# Altium footprint library PCBLIB.PcbLib: 557 footprints (part 24 of 36)
Each footprint in its own frame and in the unit in brackets; x right, y up, seen from the top. Pads: shape width x height; smd on the part's side, far side on the other; paste and mask are expansions set on the pad; w line width, h text height; cw(c..) or ccw(c..) is an arc to the next point about the centre after c.
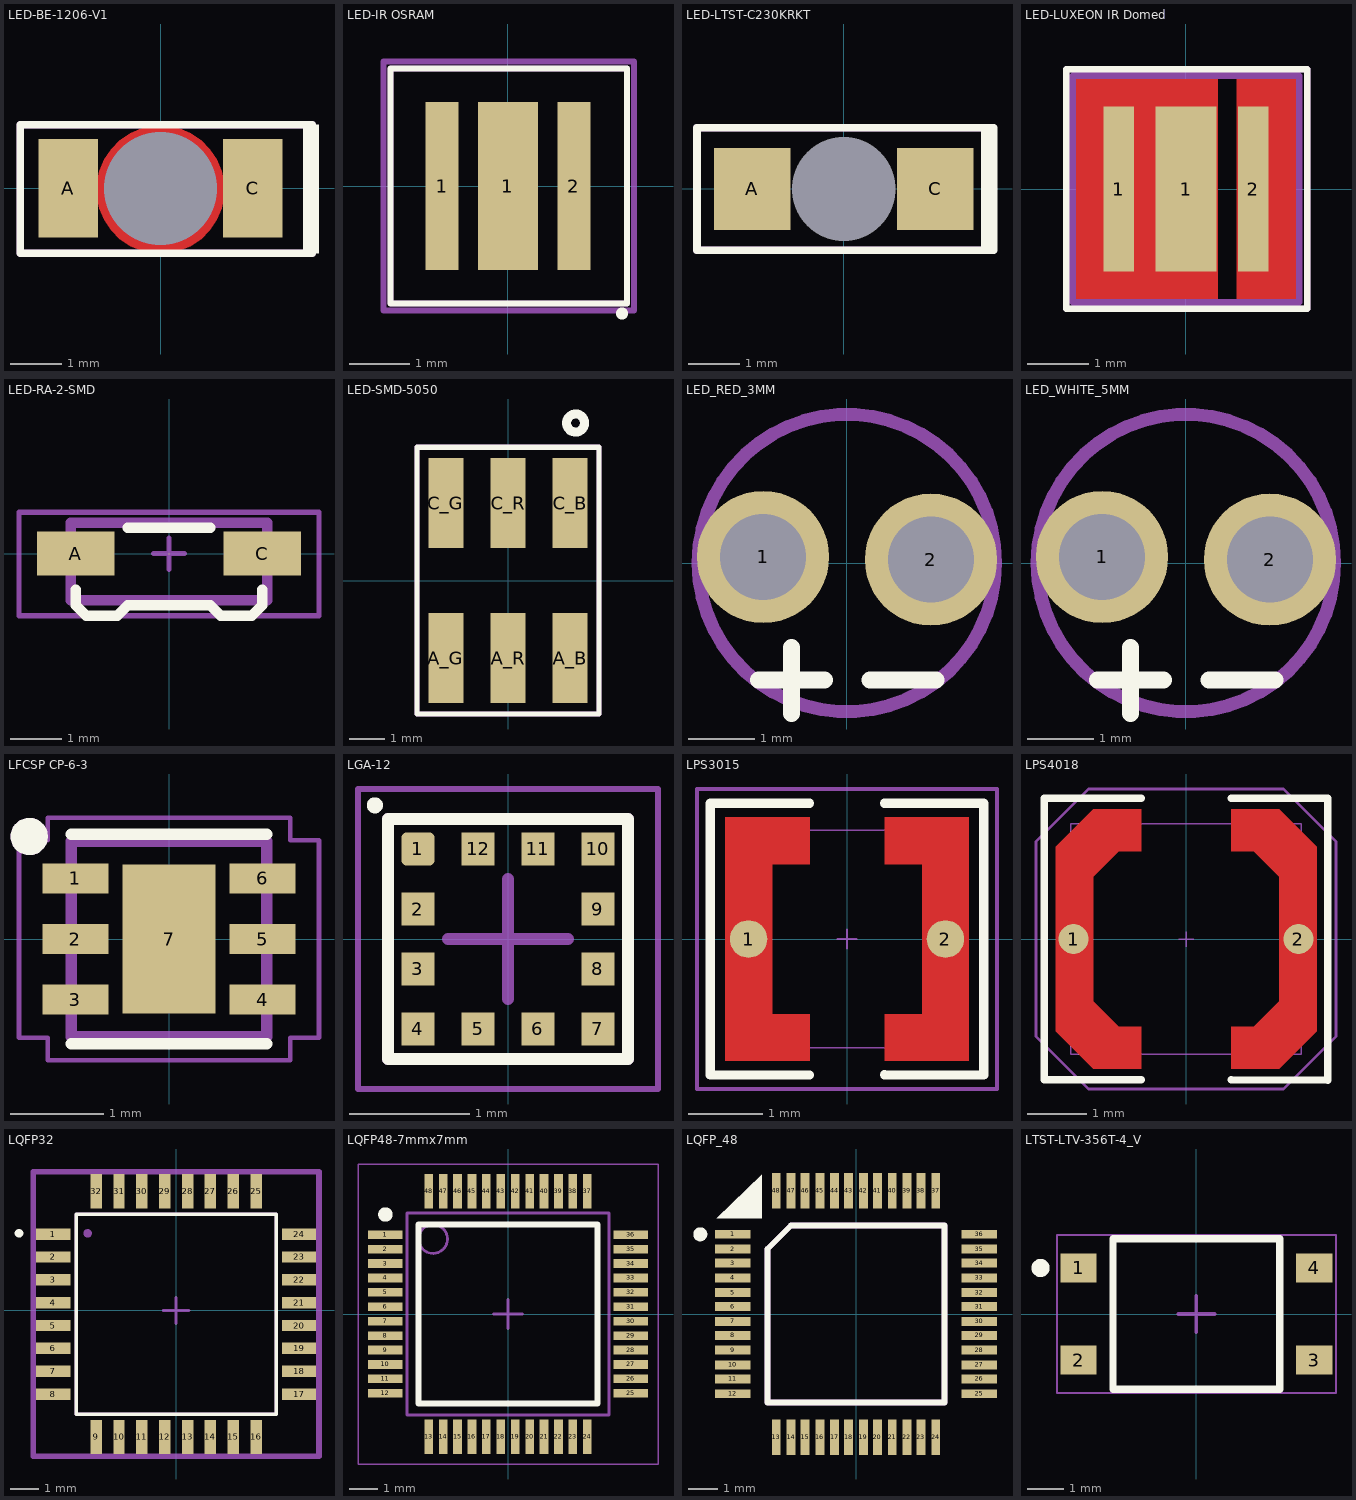
[diagram p23: the footprints below, top view; thin cyan lines are the x and y axes]

## LED-BE-1206-V1 [mil]
pads (3):
  round 1 hole 87 unplated: 1(0,0)
  rect 46x76 smd mask+1.97: A(-71,0) C(71,0)
Top Layer:
  pour cut-out: -49.04,-1 -49.04,-5.83 -47.16,-15.3 -43.46,-24.23 -38.09,-32.26 -31.26,-39.09 -23.23,-44.46 -14.3,-48.16 -4.83,-50.04 0,-50.04 4.83,-50.04 14.3,-48.16 23.23,-44.46 31.26,-39.09 38.09,-32.26 43.46,-24.23 47.16,-15.3 49.04,-5.83 49.04,-1 49.04,3.83 47.16,13.3 43.46,22.23 38.09,30.26 31.26,37.09 23.23,42.46 14.3,46.16 4.83,48.04 0,48.04 -4.83,48.04 -14.3,46.16 -23.23,42.46 -31.26,37.09 -38.09,30.26 -43.46,22.23 -47.16,13.3 -49.04,3.83
Top Overlay:
  region: 122.05,49 110,49 110,-50 122.05,-50
  lines w6: 116.83,-50 -108,-50 -108,49 116.83,49
ASM Top:
  lines w5.91: 116.83,-50 116.83,49
  lines w6: 116.83,-50 -108,-50 -108,49 116.83,49
3D body "bottom entry.STEP": height 10.38, standoff -31, extent -61,-33 64.98,30

## LED-IR OSRAM [mm] "LUXEON IR Domed (90 degree dome in 3D)"
height 0.7
pads (3):
  rect 0.55x2.8 smd paste-1 mask+0: 1(-1.1,0)
  rect 1x2.8 smd paste-5 mask+0: 1(0,0)
  rect 0.55x2.8 smd paste-2 mask+0: 2(1.1,0)
Top Overlay:
  circle w0.1: c1.9,-2.125 r0.05
  lines w0.1: -1.956,-1.956 1.981,-1.956 1.981,1.956 -1.956,1.956 -1.956,-1.956
Top Paste:
  rectangle: 0.875,-1.25 1.325,1.25
  rectangle: -0.45,0.15 0.45,1.3
  rectangle: -1.325,-1.25 -0.925,1.35
  region: 0.45,-0.15 -0.45,-0.15 -0.45,-1.3 0.45,-1.3
Mechanical 15:
  lines w0.1: -0.329,0 0.306,0 ; 0,-0.305 0,0.33 ; -2.075,-2.075 -2.075,2.075 2.1,2.075 2.1,-2.075 -2.075,-2.075
ASM Top:
  lines w0.1: -1.956,-1.956 1.981,-1.956 1.981,1.956 -1.956,1.956 -1.956,-1.956
  text ".designator" at -0.66,-0.152 h0.8
3D body "SFH_4717AS_A01_20180620_geometry.STEP": height 2.67, standoff 0.01, extent -1.925,-1.925 1.925,1.925

## LED-LTST-C230KRKT [mil]
pads (3):
  rect 1x1 hole 80 unplated: 96(0,0)
  rect 59x63 smd mask+1.97: A(-70.5,0) C(70.5,0)
Top Overlay:
  region: 118.11,47.24 105.86,47.24 105.86,-47.24 118.11,-47.24
  lines w6: 115.4,-47.24 -113,-47.24 -113,47.24 115.4,47.24
ASM Top:
  lines w5.91: 110.57,-47.24 110.57,47.24
  lines w6: 110.57,-47.24 -113,-47.24 -113,47.24 110.57,47.24
  text ".designator" at -95,-27 h31.5
3D body "LTST-C230KRKT.STEP": height 12.31, standoff -31.39, extent -64.35,-32 64,31

## LED-LUXEON IR Domed [mm] "LUXEON IR Domed (90 degree dome in 3D)"
height 0.7
pads (3):
  rect 0.5x2.7 smd paste-1 mask+0: 1(-1.1,0)
  rect 1x2.7 smd paste-5 mask+0: 1(0,0)
  rect 0.5x2.7 smd paste-2 mask+0: 2(1.1,0)
Top Layer:
  rectangle: 0.825,-1.8 1.8,1.8
  rectangle: -0.41,-1.4 0.41,-1.29
  region: 0.41,1.4 -0.41,1.4 -0.41,1.29 0.41,1.29
  rectangle: -1.8,-1.8 0.525,1.8
Top Overlay:
  lines w0.1: -1.956,-1.956 -1.956,1.956 1.981,1.956 1.981,-1.956 -1.956,-1.956
Top Paste:
  rectangle: -1.325,-1.25 -0.875,1.25
  rectangle: -0.45,-1.25 0.45,1.25
  rectangle: 0.875,-1.25 1.325,1.25
Mechanical 15:
  lines w0.1: -0.329,0 0.306,0 ; 0,-0.305 0,0.33 ; -1.85,-1.85 1.85,-1.85 1.85,1.85 -1.85,1.85 -1.85,-1.85
ASM Top:
  lines w0.1: -1.956,-1.956 -1.956,1.956 1.981,1.956 1.981,-1.956 -1.956,-1.956
  text ".designator" at -0.66,-0.152 h0.8
3D body "LUXEON IR Domed Line 90 Deg 00000463 20161011.STEP": height 2.77, standoff 0, extent -1.85,-1.85 1.85,1.85

## LED-RA-2-SMD [mm]
pads (2):
  rect 1.5x0.85 smd: A(-1.8,0) C(1.8,0)
Top Overlay:
  lines w0.2: -1.8,-0.7 -1.8,-0.997 -1.597,-1.2 -1,-1.2 -0.8,-1 0,-1 0.8,-1 1,-1.2 1.6,-1.2 1.8,-1 1.8,-0.7 ; -0.8,0.5 0.8,0.5
Mechanical 15:
  lines w0.1: -0.3,0 0.3,0 ; 0,-0.3 0,0 0,0.3 ; -2.9,-1.2 2.9,-1.2 2.9,0.8 -2.9,0.8 -2.9,-1.2
ASM Top:
  lines w0.2: -1.9,-0.9 1.9,-0.9 1.9,0.6 -1.9,0.6 -1.9,-0.9
  text ".designator" at -0.5,-0.5 h0.8
3D body "CUW_Y3SH_121213_geometry.STEP": height 0.61, standoff 0.01, extent -1.9,-1 1.9,0

## LED-SMD-5050 [mil]
pads (6):
  rect 39x100 smd: A_B(69,-86) A_G(-69,-86) A_R(0,-86) C_B(69,86) C_G(-69,86) C_R(0,86)
Top Overlay:
  circle w10: c75,175 r10
  lines w6: -101,-148 101,-148 101,148 -101,148 -101,-148
ASM Top:
  lines w6: -101,-148 101,-148 101,148 -101,148 -101,-148
  text ".designator" at -65,-13 h31.5
3D body "smd_led_5050.STEP": height 62.99, standoff 0, extent -98.85,-104.66 98,104

## LED_RED_3MM [mm]
height 8.8
pads (2):
  round 2 hole 1.3: 1(-1.269,0.091) 2(1.271,0.051)
Top Overlay:
  lines w0.254: -1.34,-1.77 -0.34,-1.77 ; -0.84,-2.28 -0.84,-1.28 ; 0.35,-1.77 1.35,-1.77
ASM Top:
  circle w0.2: c0,0 r2.25
  text ".designator" at -0.7,-0.2 h0.8
3D body: height 0.25, standoff 0, extent 0,0 0,0
3D body "STEP-WL-TMRC-3mm-wos-rev1.stp": height 5.31, standoff -26.39, extent -1.9,-1.85 1.67,2

## LED_WHITE_5MM [mm]
height 8.8
pads (2):
  round 2 hole 1.3: 1(-1.269,0.091) 2(1.271,0.051)
Top Overlay:
  lines w0.254: -1.34,-1.77 -0.34,-1.77 ; -0.84,-2.28 -0.84,-1.28 ; 0.35,-1.77 1.35,-1.77
ASM Top:
  circle w0.2: c0,0 r2.25
  text ".designator" at -0.7,-0.2 h0.8
3D body "User Library-5MM-LED-CLEAR.STEP": height 8.61, standoff -7.36, extent -2.615,-2.82 2.835,3.08
3D body: height 0.25, standoff 0, extent 0,0 0,0

## LFCSP CP-6-3 [mm] "6-Lead Lead Frame Chip Scale Package [LFCSP]  2.00 mm × 2.00 mm Body and 0.55 mm Package Height"
height 0.6
pads (7):
  rect 0.71x0.32 smd: 1(-1.005,0.65) 2(-1.005,0) 3(-1.005,-0.65) 4(1.005,-0.65) 5(1.005,0) 6(1.005,0.65)
  rect 1x1.6 smd paste-2: 7(0,0)
Top Overlay:
  circle w0.2: c-1.5,1.1 r0.1
  lines w0.127: -1.05,-1.124 1.05,-1.124 ; -1.05,1.124 1.05,1.124
Top Paste:
  region: 0.32,-0.68 -0.32,-0.68 -0.32,-0.06 0.32,-0.06
  region: 0.32,0.06 -0.32,0.06 -0.32,0.68 0.32,0.68
Mechanical 15:
  lines w0.05: -1.61,-1.06 -1.3,-1.06 -1.3,-1.3 1.3,-1.3 1.3,-1.06 1.61,-1.06 1.61,1.06 1.3,1.06 1.3,1.3 -1.3,1.3 -1.3,1.06 -1.61,1.06 -1.61,-1.06
ASM Top:
  circle w0.2: c-1.5,1.1 r0.1
  lines w0.127: -1.05,-1.05 -1.05,1.05 1.05,1.05 1.05,-1.05 -1.05,-1.05
  text ".designator" at -0.8,-0.4 h0.8
3D body "LFCSP CP-6-3.step": height 0.6, standoff 0, extent -1.2,-1 1.3,1.1

## LGA-12 [mm] "LGA, 12-Leads, Body 2.00x2.00mmx1.00mm, Pitch 0.50mm"
height 1
pads (12):
  rrect30% 0.275x0.275 smd paste-0.01 mask+0.01: 1(-0.75,0.75)
  rect 0.275x0.275 smd paste-0.01 mask+0.01: 2(-0.75,0.25) 3(-0.75,-0.25) 4(-0.75,-0.75) 5(-0.25,-0.75) 6(0.25,-0.75) 7(0.75,-0.75) 8(0.75,-0.25) 9(0.75,0.25) 10(0.75,0.75) 11(0.25,0.75) 12(-0.25,0.75)
Top Overlay:
  circle w0.1: c-1.109,1.114 r0.017
  lines w0.1: -1,-1 1,-1 1,1 -1,1 -1,-1
Mechanical 15:
  lines w0.05: -1.25,-1.25 1.25,-1.25 1.25,1.25 -1.25,1.25 -1.25,-1.25
  lines w0.1: -0.5,0 0.5,0 ; 0,-0.5 0,0.5
ASM Top:
  lines w0.1: -1,-1 -1,1 1,1 1,-1 -1,-1
  text ".designator" at -0.8,-0.2 h0.8
3D body "User Library-lga-2x2x0_9.step": height 0.95, standoff 0, extent -1,-1 1,1

## LPS3015 [mil] "Coilcraft Shielded SMT Power Inductors"
height 55
pads (2):
  round 20 smd mask+0: 1(-52.5,0) 2(52.5,0)
Top Layer:
  region: 65,-65 20,-65 20,-40 40,-40 40,40 20,40 20,65 65,65
  region: -65,65 -20,65 -20,40 -40,40 -40,-40 -20,-40 -20,-65 -65,-65
Top Overlay:
  lines w5: -20,-72.5 -73,-72.5 -73,72.5 -20,72.5 ; 20,-72.5 73,-72.5 73,72.5 20,72.5
Top Paste:
  region: -65,65 -20,65 -20,40 -40,40 -40,-40 -20,-40 -20,-65 -65,-65
  region: 65,-65 20,-65 20,-40 40,-40 40,40 20,40 20,65 65,65
Mechanical 14:
  lines w1: -58,-58 58,-58 58,58 -58,58 -58,-58
Mechanical 15:
  lines w1: -5,0 5,0 ; 0,-5 0,5
  lines w2: -80,-80 80,-80 80,80 -80,80 -80,-80
3D body "LPS3015.STEP": height 59.06, standoff 0, extent -62.13,-62.13 62.13,62.13

## LPS4018 [mil] "Coilcraft Shielded SMT Power Inductors"
height 66.9
pads (2):
  round 20 smd mask+0: 1(-75,0) 2(75,0)
Top Layer:
  region: 30.03,86.61 62.03,86.61 87.03,61.61 87.03,-61.39 62.03,-86.39 30.03,-86.39 30.03,-58.39 45.03,-58.39 62.03,-41.39 62.03,41.61 45.03,58.61 30.03,58.61
  region: -29.97,-86.39 -61.97,-86.39 -86.97,-61.39 -86.97,61.61 -61.97,86.61 -29.97,86.61 -29.97,58.61 -44.97,58.61 -61.97,41.61 -61.97,-41.39 -44.97,-58.39 -29.97,-58.39
Top Overlay:
  lines w5: -30,-94 -94.5,-94 -94.5,94 -30,94 ; 30.03,-94 94.5,-94 94.5,94 30.03,94
Top Paste:
  region: 30.03,86.61 62.03,86.61 87.03,61.61 87.03,-61.39 62.03,-86.39 30.03,-86.39 30.03,-58.39 45.03,-58.39 62.03,-41.39 62.03,41.61 45.03,58.61 30.03,58.61
  region: -29.97,-86.39 -61.97,-86.39 -86.97,-61.39 -86.97,61.61 -61.97,86.61 -29.97,86.61 -29.97,58.61 -44.97,58.61 -61.97,41.61 -61.97,-41.39 -44.97,-58.39 -29.97,-58.39
Mechanical 14:
  lines w1: -76.75,-76.75 76.75,-76.75 76.75,76.75 -76.75,76.75 -76.75,-76.75
Mechanical 15:
  lines w1: -5,0 5,0 ; 0,-5 0,5
  lines w1.97: -100,-65 -100,65 -65,100 65,100 100,65 100,-65 65,-100 -65,-100 -100,-65
3D body "LPS4018.STEP": height 70.87, standoff 0, extent -80.83,-80.83 80.83,80.83

## LQFP32 [mm]
pads (32):
  rect 1.2x0.4 smd: 1(-4.3,2.673) 2(-4.3,1.873) 3(-4.3,1.073) 4(-4.3,0.273) 5(-4.3,-0.527) 6(-4.3,-1.327) 7(-4.3,-2.127) 8(-4.3,-2.927) 17(4.3,-2.927) 18(4.3,-2.127) 19(4.3,-1.327) 20(4.3,-0.527) 21(4.3,0.273) 22(4.3,1.073) 23(4.3,1.873) 24(4.3,2.673)
  rect 0.4x1.2 smd: 9(-2.8,-4.427) 10(-2,-4.427) 11(-1.2,-4.427) 12(-0.4,-4.427) 13(0.4,-4.427) 14(1.2,-4.427) 15(2,-4.427) 16(2.8,-4.427) 25(2.8,4.173) 26(2,4.173) 27(1.2,4.173) 28(0.4,4.173) 29(-0.4,4.173) 30(-1.2,4.173) 31(-2,4.173) 32(-2.8,4.173)
Top Overlay:
  circle w0.3: c-5.5,2.7 r0.001
  lines w0.127: -3.5,-3.627 3.5,-3.627 3.5,3.373 -3.5,3.373 -3.5,-3.627
Mechanical 15:
  lines w0.1: -0.45,0 0.45,0 ; -0.006,-0.45 -0.006,0.45
  lines w0.2: -5,-5.1 5,-5.1 5,4.853 -5,4.853 -5,-5.1
ASM Top:
  circle w0.3: c-3.1,2.7 r0.001
  lines w0.127: -3.5,-3.627 3.5,-3.627 3.5,3.373 -3.5,3.373 -3.5,-3.627
  text ".designator" at -0.1,-0.1 h0.8
3D body "LQFP32.STEP": height 1.5, standoff 0.02, extent -4.5,-4.6 4.5,4.4

## LQFP48-7mmx7mm [mm] "TSQFP, 48-Leads, Body 7,00x7,00mm, Pitch 0,50mm, IPC Medium Density"
height 1.6
pads (48):
  rect 1.2x0.3 smd mask+0.09: 1(-4.25,2.75) 2(-4.25,2.25) 3(-4.25,1.75) 4(-4.25,1.25) 5(-4.25,0.75) 6(-4.25,0.25) 7(-4.25,-0.25) 8(-4.25,-0.75) 9(-4.25,-1.25) 10(-4.25,-1.75) 11(-4.25,-2.25) 12(-4.25,-2.75) 25(4.25,-2.75) 26(4.25,-2.25) 27(4.25,-1.75) 28(4.25,-1.25) 29(4.25,-0.75) 30(4.25,-0.25) 31(4.25,0.25) 32(4.25,0.75) 33(4.25,1.25) 34(4.25,1.75) 35(4.25,2.25) 36(4.25,2.75)
  rect 0.3x1.2 smd mask+0.09: 13(-2.75,-4.25) 14(-2.25,-4.25) 15(-1.75,-4.25) 16(-1.25,-4.25) 17(-0.75,-4.25) 18(-0.25,-4.25) 19(0.25,-4.25) 20(0.75,-4.25) 21(1.25,-4.25) 22(1.75,-4.25) 23(2.25,-4.25) 24(2.75,-4.25) 37(2.75,4.25) 38(2.25,4.25) 39(1.75,4.25) 40(1.25,4.25) 41(0.75,4.25) 42(0.25,4.25) 43(-0.25,4.25) 44(-0.75,4.25) 45(-1.25,4.25) 46(-1.75,4.25) 47(-2.25,4.25) 48(-2.75,4.25)
Top Overlay:
  circle w0.25: c-4.25,3.45 r0.125
  lines w0.2: -3.1,-3.1 -3.1,3.1 3.1,3.1 3.1,-3.1 -3.1,-3.1
Mechanical 15:
  lines w0.05: -5.2,-5.2 -5.2,5.2 5.2,5.2 5.2,-5.2 -5.2,-5.2
  lines w0.1: -0.5,0 0.5,0 ; 0,-0.5 0,0.5
ASM Top:
  circle w0.1: c-2.6,2.6 r0.5
  lines w0.1: -3.5,-3.5 3.5,-3.5 3.5,3.5 -3.5,3.5 -3.5,-3.5
  text ".designator" at -0.4,0 h0.8
3D body "LQFP48-7mmx7mm.step": height 1.6, standoff 0, extent -4.5,-4.5 4.5,4.5

## LQFP_48 [mil]
pads (48):
  rect 48x12 smd mask+0: 1(-167,108) 2(-167,88) 3(-167,69) 4(-167,49) 5(-167,29) 6(-167,10) 7(-167,-10) 8(-167,-29) 9(-167,-49) 10(-167,-69) 11(-167,-88) 12(-167,-108) 25(167,-108) 26(167,-88) 27(167,-69) 28(167,-49) 29(167,-29) 30(167,-10) 31(167,10) 32(167,29) 33(167,49) 34(167,69) 35(167,88) 36(167,108)
  rect 12x48 smd mask+0: 13(-108,-167) 14(-88,-167) 15(-69,-167) 16(-49,-167) 17(-29,-167) 18(-10,-167) 19(10,-167) 20(29,-167) 21(49,-167) 22(69,-167) 23(88,-167) 24(108,-167) 37(108,167) 38(88,167) 39(69,167) 40(49,167) 41(29,167) 42(10,167) 43(-10,167) 44(-29,167) 45(-49,167) 46(-69,167) 47(-88,167) 48(-108,167)
Top Overlay:
  circle w10: c-211,108 r4.47
  region: -189,130 -128,130 -128,189
  lines w8: -120,-120 120,-120 120,120 -88,120 -120,88 -120,-120
ASM Top:
  lines w8: -120,-120 -120,88 -88,120 120,120 120,-120 -120,-120
  text ".designator" at -97,-14 h31.5
3D body "SW3dPS-Quad50M48.STEP": height 61.92, standoff 0.5, extent -176.33,-177 178,177.33

## LTST-LTV-356T-4_V [mm] "SMD, 4-Leads, Body 4.6x4.15mm, Pitch 2.54mm"
height 2.32
pads (4):
  rect 1x0.8 smd: 1(-3.25,1.27) 2(-3.25,-1.27) 3(3.25,-1.27) 4(3.25,1.27)
Top Overlay:
  circle w0.25: c-4.3,1.27 r0.125
  lines w0.2: -2.3,-2.075 -2.3,2.075 2.3,2.075 2.3,-2.075 -2.3,-2.075
Mechanical 15:
  lines w0.05: -3.85,-2.175 -3.85,2.175 3.85,2.175 3.85,-2.175 -3.85,-2.175
  lines w0.1: -0.5,0 0.5,0 ; 0,-0.5 0,0.5
ASM Top:
  lines w0.1: -2.3,-2.075 -2.3,2.075 2.3,2.075 2.3,-2.075 -2.3,-2.075
  text ".designator" at -0.436,0 h0.8
3D body "User Library-SOP254P665X290.STEP": height 2.9, standoff 0, extent -3.277,-2.489 3.409,2.461